# Altium footprint library nRF52-Intro.PcbLib: 48 footprints (part 1 of 3)
Each footprint in its own frame and in the unit in brackets; x right, y up, seen from the top. Pads: shape width x height; smd on the part's side, far side on the other; paste and mask are expansions set on the pad; w line width, h text height; cw(c..) or ccw(c..) is an arc to the next point about the centre after c.
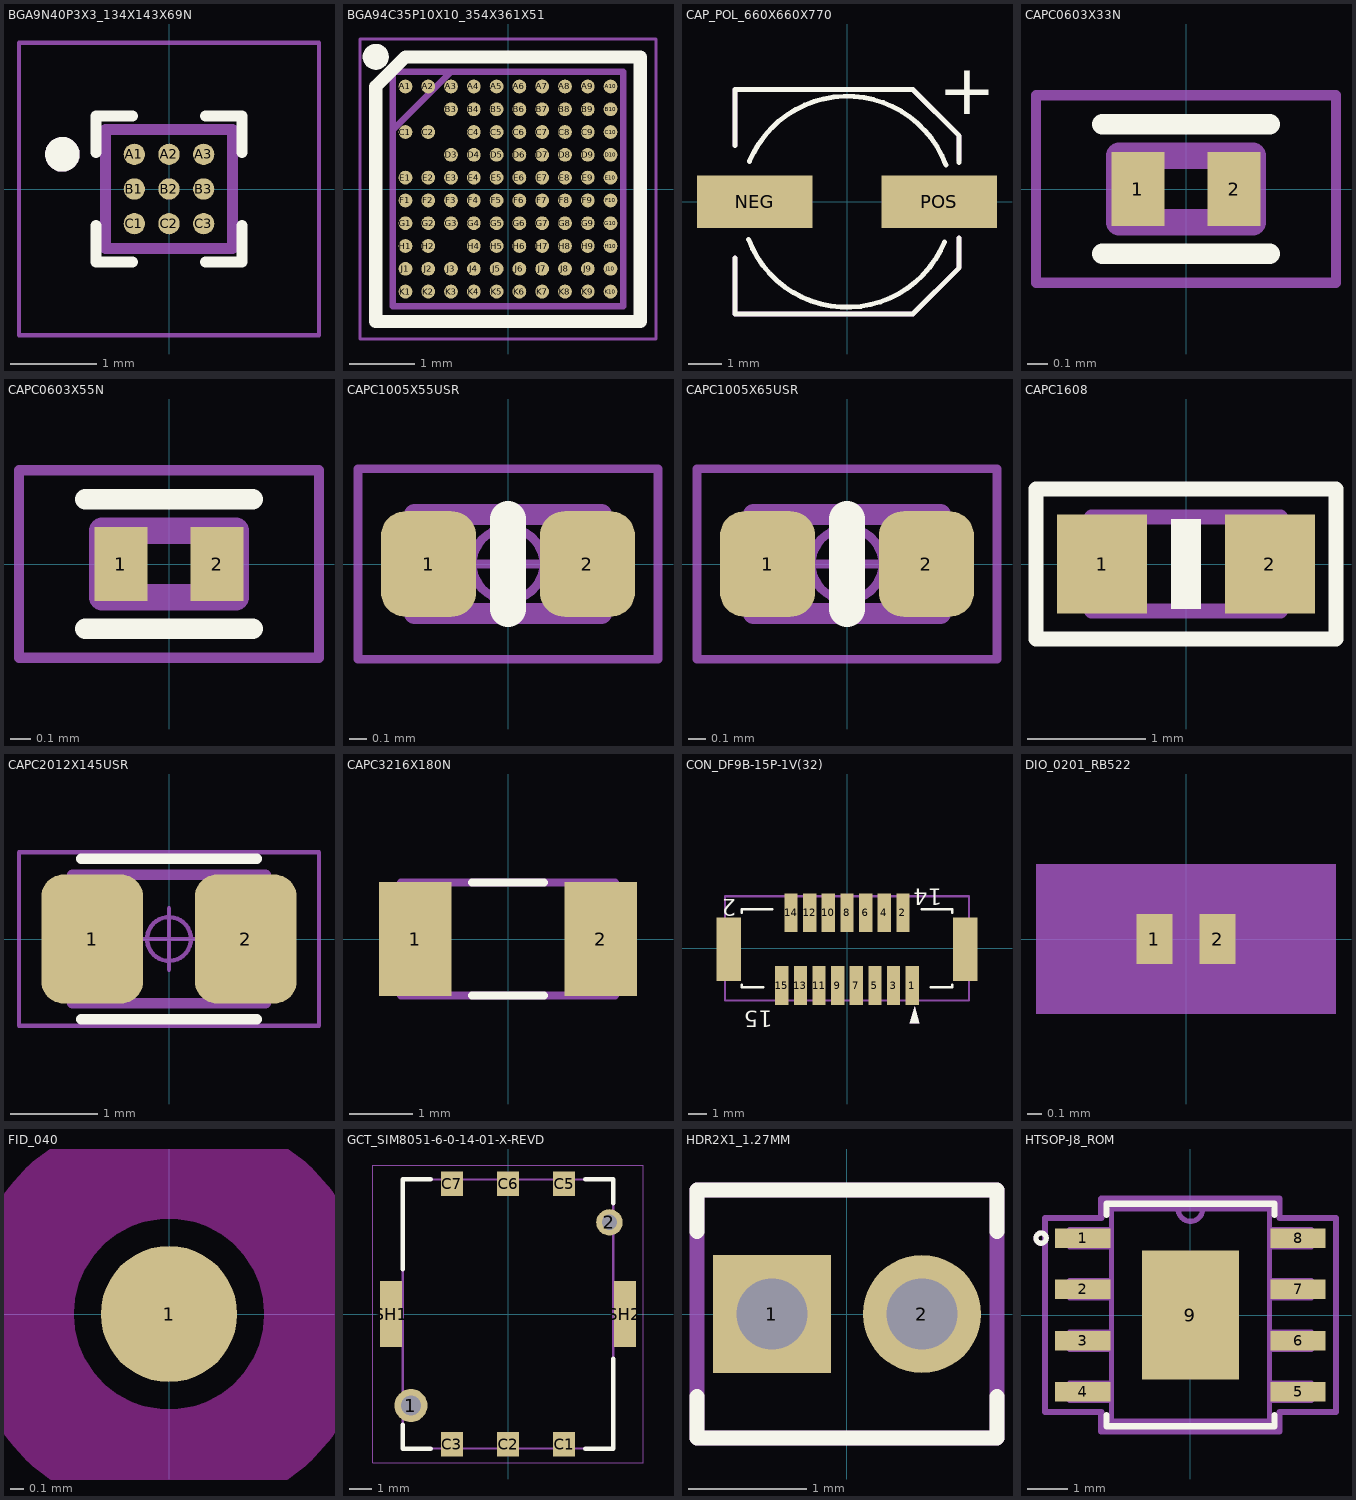
[diagram p0: the footprints below, top view; thin cyan lines are the x and y axes]

## BGA9N40P3X3_134X143X69N [mm]
pads (9):
  round 0.246 smd mask+0.051: A1(-0.4,0.4) A2(0,0.4) A3(0.4,0.4) B1(-0.4,0) B2(0,0) B3(0.4,0) C1(-0.4,-0.4) C2(0,-0.4) C3(0.4,-0.4)
Top Overlay:
  circle w0.2: c-1.231,0.4 r0.1
  lines w0.127: -0.845,-0.423 -0.845,-0.845 -0.423,-0.845 ; -0.845,0.423 -0.845,0.845 -0.423,0.845 ; 0.423,-0.845 0.845,-0.845 0.845,-0.423 ; 0.423,0.845 0.845,0.845 0.845,0.423
Top Assembly:
  circle w0.2: c-1.231,0.4 r0.1
  lines w0.127: -0.731,-0.686 -0.731,0.686 0.731,0.686 0.731,-0.686 -0.731,-0.686
  text ".Designator" at -0.457,-0.337 h1.02
Top Courtyard:
  lines w0.05: -1.731,-1.686 -1.731,1.686 1.731,1.686 1.731,-1.686 -1.731,-1.686
3D body "21-0896B_9_MXM.step": height 0.69, standoff 0, extent -0.724,-0.673 0.724,0.673

## BGA94C35P10X10_354X361X51 [mm]
pads (94):
  round 0.212 smd mask+0.025: A1(-1.575,1.575) A2(-1.225,1.575) A3(-0.875,1.575) A4(-0.525,1.575) A5(-0.175,1.575) A6(0.175,1.575) A7(0.525,1.575) A8(0.875,1.575) A9(1.225,1.575) A10(1.575,1.575) B3(-0.875,1.225) B4(-0.525,1.225) B5(-0.175,1.225) B6(0.175,1.225) B7(0.525,1.225) B8(0.875,1.225) B9(1.225,1.225) B10(1.575,1.225) C1(-1.575,0.875) C2(-1.225,0.875) C4(-0.525,0.875) C5(-0.175,0.875) C6(0.175,0.875) C7(0.525,0.875) C8(0.875,0.875) C9(1.225,0.875) C10(1.575,0.875) D3(-0.875,0.525) D4(-0.525,0.525) D5(-0.175,0.525) D6(0.175,0.525) D7(0.525,0.525) D8(0.875,0.525) D9(1.225,0.525) D10(1.575,0.525) E1(-1.575,0.175) E2(-1.225,0.175) E3(-0.875,0.175) E4(-0.525,0.175) E5(-0.175,0.175) E6(0.175,0.175) E7(0.525,0.175) E8(0.875,0.175) E9(1.225,0.175) E10(1.575,0.175) F1(-1.575,-0.175) F2(-1.225,-0.175) F3(-0.875,-0.175) F4(-0.525,-0.175) F5(-0.175,-0.175) F6(0.175,-0.175) F7(0.525,-0.175) F8(0.875,-0.175) F9(1.225,-0.175) F10(1.575,-0.175) G1(-1.575,-0.525) G2(-1.225,-0.525) G3(-0.875,-0.525) G4(-0.525,-0.525) G5(-0.175,-0.525) G6(0.175,-0.525) G7(0.525,-0.525) G8(0.875,-0.525) G9(1.225,-0.525) G10(1.575,-0.525) H1(-1.575,-0.875) H2(-1.225,-0.875) H4(-0.525,-0.875) H5(-0.175,-0.875) H6(0.175,-0.875) H7(0.525,-0.875) H8(0.875,-0.875) H9(1.225,-0.875) H10(1.575,-0.875) J1(-1.575,-1.225) J2(-1.225,-1.225) J3(-0.875,-1.225) J4(-0.525,-1.225) J5(-0.175,-1.225) J6(0.175,-1.225) J7(0.525,-1.225) J8(0.875,-1.225) J9(1.225,-1.225) J10(1.575,-1.225) K1(-1.575,-1.575) K2(-1.225,-1.575) K3(-0.875,-1.575) K4(-0.525,-1.575) K5(-0.175,-1.575) K6(0.175,-1.575) K7(0.525,-1.575) K8(0.875,-1.575) K9(1.225,-1.575) K10(1.575,-1.575)
Top Overlay:
  circle w0.2: c-2.031,2.031 r0.1
  lines w0.2: -2.031,-2.031 2.031,-2.031 2.031,2.031 -1.575,2.031 -2.031,1.575 -2.031,-2.031
Top Assembly:
  lines w0.1: -1.772,0.902 -0.87,1.804 ; -1.772,-1.803 1.772,-1.803 1.772,1.804 -1.772,1.804 -1.772,-1.803
  text ".Designator" at -0.474,-0.11 h1.02
Top Courtyard:
  lines w0.05: -2.272,-2.303 -2.272,2.304 2.272,2.304 2.272,-2.303 -2.272,-2.303
3D body "NRF52840-CKAA-R7.stp": height 0.51, standoff 0, extent -1.772,-1.803 1.772,1.803

## CAP_POL_660X660X770 [mm]
pads (2):
  rect 3.5x1.6 smd: NEG(-2.8,0) POS(2.8,0)
Top Overlay:
  lines w0.15: -3.4,-1.7 -3.4,-3.4 2,-3.4 3.4,-2 3.4,-1.092 ; -3.4,1.7 -3.4,3.4 2,3.4 3.4,2 3.4,1.194 ; -2.987,-1.149 ccw(c0,0) 2.959,-1.218 ; -2.959,1.218 cw(c0,0) 2.998,1.118
  text "+" at 2.762,2.648 h1.52
Top Assembly:
  lines w0.15: -3.4,-1.7 -3.4,-3.4 2,-3.4 3.4,-2 3.4,-1.092 ; -3.4,1.7 -3.4,3.4 2,3.4 3.4,2 3.4,1.274
  text ".Designator" at -0.584,-0.336 h1.02
3D body "865080545012.stp": height 7.7, standoff 0, extent -3.4,-3.4 3.4,3.4

## CAPC0603X33N [mil]
pads (2):
  rect 10x14 smd mask+2: 1(-9.06,0) 2(9.06,0)
Top Overlay:
  lines w3.94: -15.75,-12.2 15.75,-12.2 ; -15.75,12.2 15.75,12.2
Top Assembly:
  lines w5: -12.6,-6.3 -12.6,6.3 12.6,6.3 12.6,-6.3 -12.6,-6.3
  text ".Designator" at 17,-6.24 h20
Top Courtyard:
  lines w1.97: -28.27,-17.64 28.27,-17.64 28.27,17.64 -28.27,17.64 -28.27,-17.64
3D body "C0603X7S1A104K030BC.STEP": height 12.99, standoff 0, extent -11.81,-5.91 11.81,5.91

## CAPC0603X55N [mil]
pads (2):
  rect 10x14 smd mask+2: 1(-9.06,0) 2(9.06,0)
Top Overlay:
  lines w3.94: -15.75,-12.2 15.75,-12.2 ; -15.75,12.2 15.75,12.2
Top Assembly:
  lines w5: -12.6,-6.3 12.6,-6.3 12.6,6.3 -12.6,6.3 -12.6,-6.3
  text ".Designator" at 17,-6.24 h20
Top Courtyard:
  lines w1.97: -28.27,-17.64 -28.27,17.64 28.27,17.64 28.27,-17.64 -28.27,-17.64
3D body "GRM035R60J475ME15J.STEP": height 21.65, standoff 0, extent -11.81,-5.91 11.81,5.91

## CAPC1005X55USR [mm] "Capacitor, Chip; 1.00 mm L X 0.50 mm W X 0.55 mm H body"
height 0.55
pads (2):
  rrect52% 0.54x0.6 smd mask+0.025: 1(-0.45,0) 2(0.45,0)
Top Overlay:
  lines w0.203: 0,-0.254 0,0.254
Top Assembly:
  lines w0.12: -0.53,-0.28 0.53,-0.28 0.53,0.28 -0.53,0.28 -0.53,-0.28
  text ".Designator" at -0.381,-0.159 h0.51
Top Courtyard:
  circle w0.05: c0,0 r0.202
  lines w0.05: -0.27,0 0.27,0 ; 0,-0.27 0,0.27 ; -0.85,-0.54 0.85,-0.54 0.85,0.54 -0.85,0.54 -0.85,-0.54
3D body "CAPC1005X55USR.STEP": height 0.55, standoff 0, extent -0.5,-0.25 0.5,0.25

## CAPC1005X65USR [mm] "Capacitor, Chip; 1.00 mm L X 0.50 mm W X 0.55 mm H body"
height 0.55
pads (2):
  rrect52% 0.54x0.6 smd mask+0.025: 1(-0.45,0) 2(0.45,0)
Top Overlay:
  lines w0.203: 0,-0.254 0,0.254
Top Assembly:
  lines w0.12: -0.53,-0.28 -0.53,0.28 0.53,0.28 0.53,-0.28 -0.53,-0.28
  text ".Designator" at -0.381,-0.159 h0.51
Top Courtyard:
  circle w0.05: c0,0 r0.202
  lines w0.05: -0.27,0 0.27,0 ; 0,-0.27 0,0.27 ; -0.85,-0.54 -0.85,0.54 0.85,0.54 0.85,-0.54 -0.85,-0.54
3D body "C1005X5R1A475M050BC.STEP": height 0.55, standoff 0, extent -0.5,-0.25 0.5,0.25

## CAPC1608 [mil] "C0603"
pads (2):
  rect 30x33 smd mask+2: 1(-28,0) 2(28,0)
Top Overlay:
  rectangle: -5,-15 5,15
  lines w5: -50,-25 50,-25 50,25 -50,25 -50,-25
Top Assembly:
  lines w5: -31.5,-15.75 -31.5,15.75 31.5,15.75 31.5,-15.75 -31.5,-15.75
  text ".Designator" at -25,-15 h40
3D body "C1608X6S1C225K080AC.STEP": height 35.43, standoff 0, extent -31.49,-15.75 31.5,15.75

## CAPC2012X145USR [mm] "Capacitor, Chip; 2.00 mm L X 1.25 mm W X 1.45 mm H body"
height 1.45
pads (2):
  rrect43% 1.16x1.47 smd: 1(-0.875,0) 2(0.875,0)
Top Overlay:
  lines w0.12: -1,-0.915 1,-0.915 ; -1,0.915 1,0.915
Top Assembly:
  lines w0.12: -1.1,-0.73 1.1,-0.73 1.1,0.73 -1.1,0.73 -1.1,-0.73
  text ".Designator" at -0.787,-0.162 h0.76
Top Courtyard:
  circle w0.05: c0,0 r0.25
  lines w0.05: -0.35,0 0.35,0 ; 0,-0.35 0,0.35 ; -1.71,-0.99 1.71,-0.99 1.71,0.99 -1.71,0.99 -1.71,-0.99
3D body "CAPC2012X145USR.STEP": height 1.45, standoff 0, extent -1,-0.625 1,0.625

## CAPC3216X180N [mm]
pads (2):
  rect 1.16x1.82 smd: 1(-1.475,0) 2(1.475,0)
Top Overlay:
  lines w0.127: -0.57,-0.9 0.57,-0.9 ; -0.57,0.9 0.57,0.9
Top Assembly:
  lines w0.127: -1.7,-0.9 -1.7,0.9 1.7,0.9 1.7,-0.9 -1.7,-0.9
  text ".Designator" at -0.228,-0.18 h0.76
3D body "CAP_GMC31_CCE.step": height 1.8, standoff 0, extent -1.753,-0.902 1.753,0.902

## CON_DF9B-15P-1V(32) [mil]
pads (17):
  rect 28x82 smd mask+2: 1(137.8,-78.74) 2(118.11,75.26) 3(98.43,-78.74) 4(78.74,75.26) 5(59.06,-78.74) 6(39.37,75.26) 7(19.68,-78.74) 8(0,75.26) 9(-19.68,-78.74) 10(-39.37,75.26) 11(-59.06,-78.74) 12(-78.74,75.26) 13(-98.43,-78.74) 14(-118.11,75.26) 15(-137.8,-78.74)
  rect 51.18x134 smd mask+2: ""(-250,-1.74) ""(250,-1.74)
Top Overlay:
  region: 143,-123.5 153,-158.5 133,-158.5
  lines w5: -222.44,-76.77 -222.44,-82.68 -177.17,-82.68 ; -222.44,74.8 -222.44,82.68 -157.48,82.68 ; 157.48,82.68 222.44,82.68 222.44,74.8 ; 177.17,-82.68 222.44,-82.68 222.44,-76.77
  text "15" at -157,-120 h60
  text "14" at 201.15,137.77 h60
  text "2" at -233.66,115.72 h60
Top Assembly:
  region: 143,-123 153,-158 133,-158
  lines w5: -257.87,-110.24 -257.87,110.24 257.87,110.24 257.87,-110.24 -257.87,-110.24
  text ".Designator" at -21.24,-6.48 h30
  text "15" at -129,-128 h60
  text "2" at 87.28,125.01 h60
  text "14" at -137.22,125.01 h60
3D body "step_temp.STEP": height 129.92, standoff 0, extent -257.87,-110.24 257.87,110.24

## DIO_0201_RB522 [mm]
pads (2):
  rect 0.25x0.35 smd paste+0 mask+0: 1(-0.22,0) 2(0.22,0)
Mechanical 5:
  region: 1.041,-0.521 -1.041,-0.521 -1.041,0.521 1.041,0.521
Top Assembly:
  lines w0.025: -0.2,-0.15 -0.2,0.15 ; 0.2,-0.15 0.2,0.15 ; -0.3,-0.15 -0.3,0.15 0.3,0.15 0.3,-0.15 -0.3,-0.15
  text ".Designator" at 0.305,-0.14 h0.38
Top Courtyard:
  lines w0.152: -0.914,-0.394 0.914,-0.394 0.914,0.394 -0.914,0.394 -0.914,-0.394
3D body "DIO_RB522_ROM.step": height 0.28, standoff 0, extent -0.305,-0.14 0.305,0.14

## FID_040 [mm]
height 1.3
pads (1):
  round 1 smd paste-1.5 mask+1: 1(0,0)
Top Layer keep-out:
  circle w0.8: c0,0 r1.1

## GCT_SIM8051-6-0-14-01-X-REVD [mm]
pads (10):
  round 1.5 hole 0.9: 1(-4.4,-4.15)
  round 1.2 hole 0.7: 2(4.6,4.15)
  rect 1x1.1 smd: C1(2.54,-5.9) C2(0,-5.9) C3(-2.54,-5.9) C5(2.54,5.9) C6(0,5.9) C7(-2.54,5.9)
  rect 1x3 smd: SH1(-5.3,0) SH2(5.3,0)
Top Overlay:
  lines w0.2: -4.77,-5.02 -4.77,-6.1 -3.5,-6.1 ; -4.77,2.02 -4.77,6.1 -3.5,6.1 ; 3.5,-6.1 4.77,-6.1 4.77,-2.02 ; 3.5,6.1 4.77,6.1 4.77,5.02
Top Assembly:
  lines w0.1: -4.77,-6.1 4.77,-6.1 4.77,6.1 -4.77,6.1 -4.77,-6.1
Top Courtyard:
  lines w0.05: -6.125,-6.75 -6.125,6.75 6.125,6.75 6.125,-6.75 -6.125,-6.75
3D body "SIM8051-6-0-14-01-A.stp": height 1.35, standoff -0.4, extent -5.42,-6.103 5.42,6.097

## HDR2X1_1.27MM [mm]
pads (2):
  rect 1x1 hole 0.6 mask+0.05: 1(-0.635,0)
  round 1 hole 0.6 mask+0.05: 2(0.635,0)
Top Overlay:
  lines w0.127: -1.27,-0.7 -1.27,-1.05 1.27,-1.05 1.27,-0.7 ; -1.27,0.7 -1.27,1.05 1.27,1.05 1.27,0.7
Top Assembly:
  lines w0.127: -1.27,-1.05 1.27,-1.05 1.27,1.05 -1.27,1.05 -1.27,-1.05
  text ".Designator" at -1.023,-0.336 h1.52
3D body "M50-3530242.STEP": height 4, standoff -2.3, extent -1.27,-1.05 1.27,1.05

## HTSOP-J8_ROM [mil]
pads (9):
  rect 54x19 smd paste+0 mask+0: 1(-105,75) 2(-105,25) 3(-105,-25) 4(-105,-75) 5(105,-75) 6(105,-25) 7(105,25) 8(105,75)
  rect 95x126 smd paste-62.5 mask+0: 9(0,0)
Top Overlay:
  circle w5: c-145.67,75 r5
  lines w6: -82,-97.6 -82,-108.5 82,-108.5 82,-97.6 ; -82,97.6 -82,108.5 82,108.5 82,97.6
Top Paste:
  region: 43.56,59.06 -43.56,59.06 -43.56,3.94 43.56,3.94
  region: 43.56,-3.94 -43.56,-3.94 -43.56,-59.06 43.56,-59.06
Top Assembly:
  circle w5: c-145.67,75 r5
  lines w5: -12,103.5 ccw(c0,103.5) 12,103.5 ; -118,-83.5 -118,-66.5 -77,-66.5 -77,-83.5 -118,-83.5 ; -118,-33.5 -118,-16.5 -77,-16.5 -77,-33.5 -118,-33.5 ; -118,16.5 -118,33.5 -77,33.5 -77,16.5 -118,16.5 ; -118,66.5 -118,83.5 -77,83.5 -77,66.5 -118,66.5 ; -77,-103.5 77,-103.5 77,103.5 -77,103.5 -77,-103.5 ; 77,-83.5 77,-66.5 118,-66.5 118,-83.5 77,-83.5 ; 77,-33.5 77,-16.5 118,-16.5 118,-33.5 77,-33.5 ; 77,16.5 77,33.5 118,33.5 118,16.5 77,16.5 ; 77,66.5 77,83.5 118,83.5 118,66.5 77,66.5
  text ".Designator" at -19.92,-11.22 h50
Top Courtyard:
  lines w6: -142,-94.5 -142,94.5 -87,94.5 -87,113.5 87,113.5 87,94.5 142,94.5 142,-94.5 87,-94.5 87,-113.5 -87,-113.5 -87,-94.5 -142,-94.5
3D body "HTSOP-J8_ROM.step": height 39.09, standoff 0, extent -117.99,-103.5 117.99,103.5